# Altium footprint library mypcblib.PcbLib: 124 footprints (part 2 of 8)
Each footprint in its own frame and in the unit in brackets; x right, y up, seen from the top. Pads: shape width x height; smd on the part's side, far side on the other; paste and mask are expansions set on the pad; w line width, h text height; cw(c..) or ccw(c..) is an arc to the next point about the centre after c.
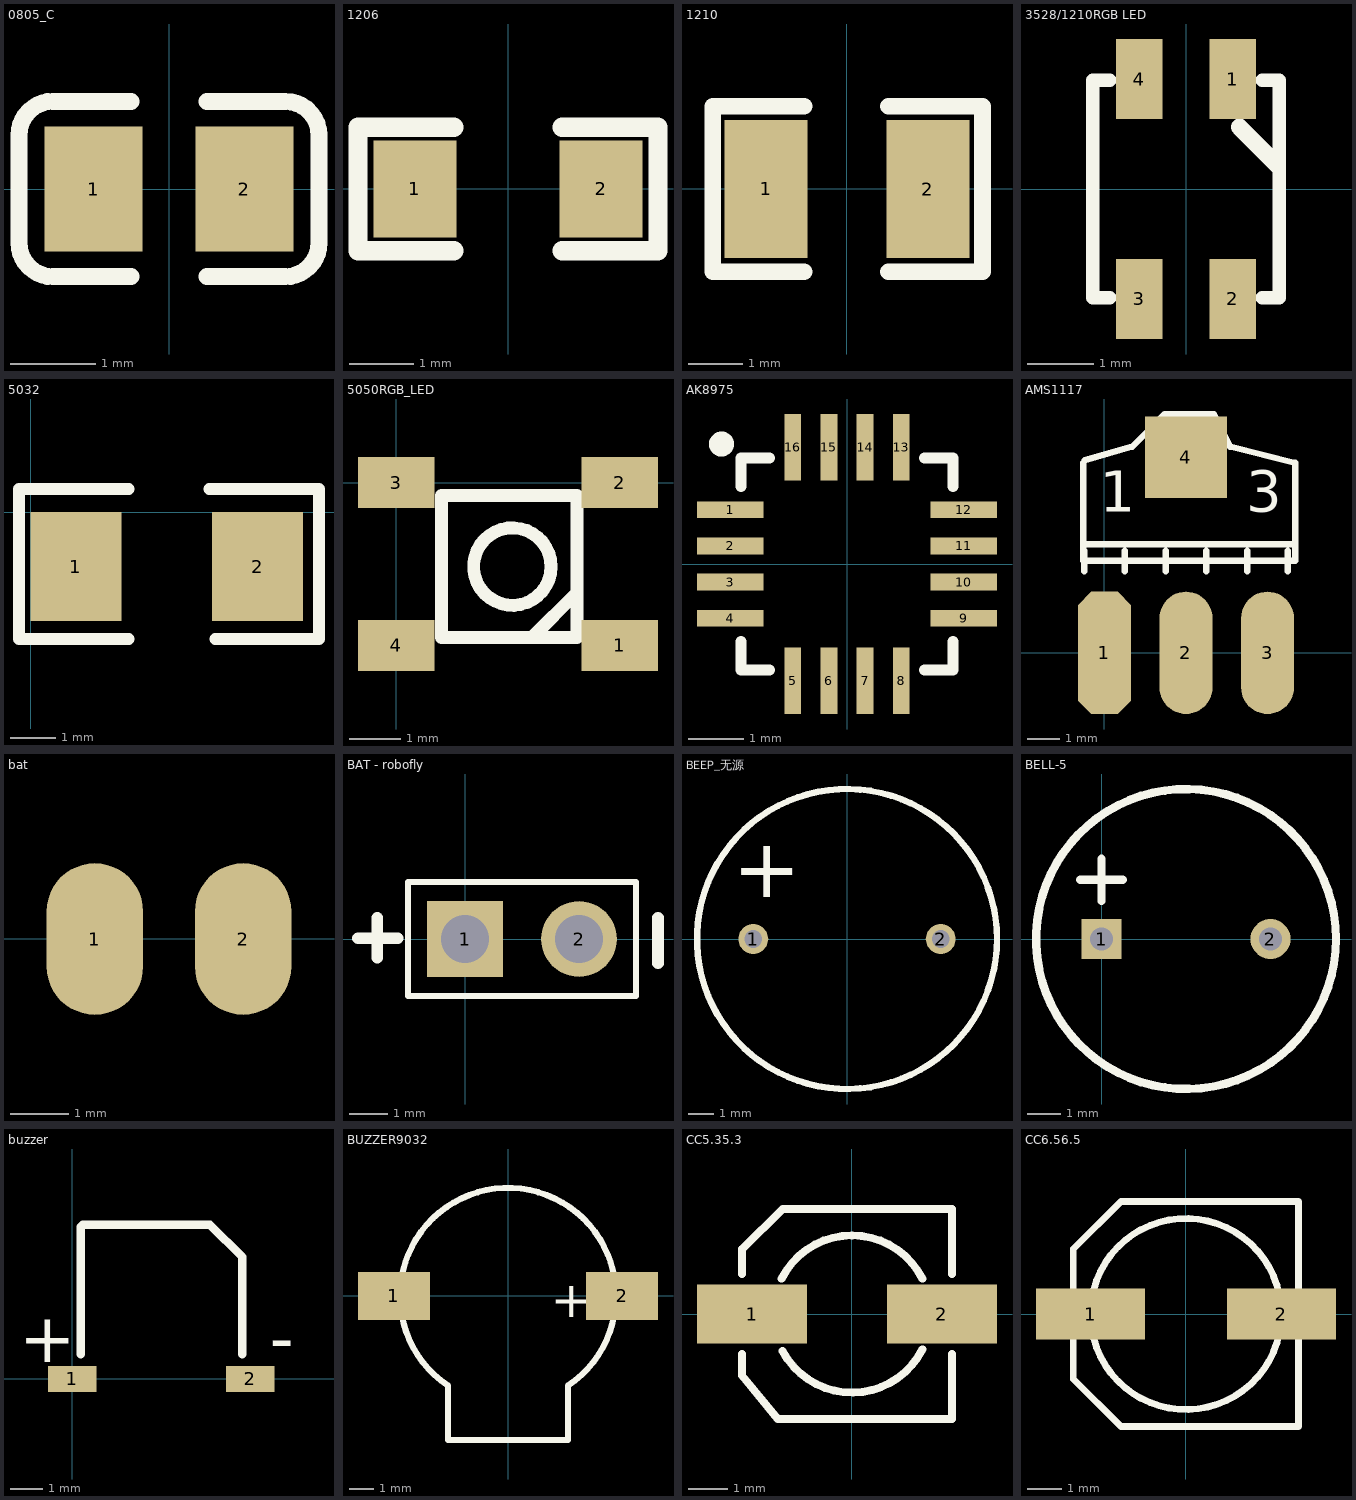
[diagram p1: the footprints below, top view; thin cyan lines are the x and y axes]

## 0805_C [mm]
pads (2):
  rect 1.16x1.47 smd: 1(-0.89,0) 2(0.89,0)
Top Overlay:
  lines w0.2: -0.45,-1.035 -1.37,-1.035 cw(c-1.37,-0.635) -1.77,-0.635 -1.77,0.635 cw(c-1.37,0.635) -1.37,1.035 -0.45,1.035 ; 0.45,-1.035 1.37,-1.035 ccw(c1.37,-0.635) 1.77,-0.635 1.77,0.635 ccw(c1.37,0.635) 1.37,1.035 0.45,1.035
3D body "User Library-0805 SMD Capacitor.STEP": height 0.77, standoff -0.01, extent -0.999,-0.625 1.001,0.625

## 1206 [mil]
pads (2):
  rect 51.18x60 smd: 1(-57.5,0) 2(57.5,0)
Top Overlay:
  lines w12: -33.46,-38 -92.52,-38 -92.52,38 -33.46,38 ; 33.46,-38 92.52,-38 92.52,38 33.46,38

## 1210 [mil]
pads (2):
  rect 60x100 smd: 1(-58.5,0) 2(58.5,0)
Top Overlay:
  lines w12: -31,-60 -97,-60 -97,60 -31,60 ; 30,-60 98,-60 98,60 30,60

## 3528/1210RGB LED [mm]
pads (4):
  rect 0.7x1.2 smd: 1(0.7,1.65) 2(0.7,-1.65) 3(-0.7,-1.65) 4(-0.7,1.65)
Top Overlay:
  lines w0.203: -1.4,-1.63 -1.143,-1.63 ; -1.4,-1.6 -1.4,1.6 ; -1.4,1.63 -1.143,1.63 ; 1.143,-1.63 1.4,-1.63 ; 1.143,1.63 1.4,1.63 ; 1.4,-1.6 1.4,1.6
  lines w0.254: 0.8,0.927 1.371,0.355

## 5032 [mm]
pads (2):
  rect 2x2.4 smd: 1(1,-1.2) 2(5,-1.2)
Top Overlay:
  lines w0.254: 2.159,-2.794 -0.254,-2.794 -0.254,0.508 2.159,0.508 ; 3.937,0.508 6.35,0.508 6.35,-2.794 4.064,-2.794

## 5050RGB_LED [mm]
pads (4):
  rect 1.5x1 smd: 1(4.4,-3.2) 2(4.4,0) 3(0,0) 4(0,-3.2)
Top Overlay:
  circle w0.254: c2.286,-1.651 r0.762
  lines w0.254: 2.667,-3.048 3.556,-2.159 ; 0.889,-3.048 3.556,-3.048 3.556,-0.254 0.889,-0.254 0.889,-3.048

## AK8975 [mm]
pads (16):
  rect 1.2x0.3 smd: 1(-2.1,0.975) 2(-2.1,0.325) 3(-2.1,-0.325) 4(-2.1,-0.975) 9(2.1,-0.975) 10(2.1,-0.325) 11(2.1,0.325) 12(2.1,0.975)
  rect 0.3x1.2 smd: 5(-0.975,-2.1) 6(-0.325,-2.1) 7(0.325,-2.1) 8(0.975,-2.1) 13(0.975,2.1) 14(0.325,2.1) 15(-0.325,2.1) 16(-0.975,2.1)
Top Overlay:
  circle w0.25: c-2.259,2.159 r0.1
  lines w0.2: -1.905,-1.397 -1.905,-1.905 -1.397,-1.905 ; -1.905,1.397 -1.905,1.905 -1.397,1.905 ; 1.397,-1.905 1.905,-1.905 1.905,-1.397 ; 1.397,1.905 1.905,1.905 1.905,1.397

## AMS1117 [mil]
pads (4):
  oct 65x150 smd: 1(0.03,-0.06)
  oval 65x150 smd: 2(100.03,-0.06) 3(200.03,-0.06)
  rect 100x100 smd: 4(100.03,239.94)
Top Overlay:
  lines w7.87: -25.97,232.94 -25.97,132.94 ; -24.97,99.94 -24.97,124.94 ; -24.3,236.27 34.03,252.94 74.03,292.94 134.03,292.94 154.03,252.94 234.03,232.94 234.03,112.94 ; 25.03,99.94 25.03,124.94 ; 75.03,99.94 75.03,124.94 ; 125.03,99.94 125.03,124.94 ; 175.03,99.94 175.03,124.94 ; 225.03,99.94 225.03,124.94 ; -25.97,132.94 -25.97,112.94 234.03,112.94 ; -25.97,132.94 234.03,132.94 234.03,112.94
  text "1" at -5.97,172.94 h50
  text "3" at 174.03,172.94 h50

## bat [mm]
pads (2):
  oval 1.651x2.6 smd: 1(2.541,-0.002) 2(5.081,-0.002)

## BAT - robofly [mm]
pads (2):
  rect 2x2 hole 1.27: 1(0,0)
  round 2 hole 1.27: 2(3,0)
Top Overlay:
  lines w0.152: -1.5,-1.5 4.5,-1.5 4.5,1.5 -1.5,1.5 -1.5,-1.5
  lines w0.305: -2.819,0.023 -1.769,0.023 ; -2.314,-0.492 -2.314,0.559 ; 5.08,-0.641 5.08,0.559

## BEEP_无源 [mm] "无源蜂鸣器，直径12mm，脚距7.5mm"
pads (2):
  round 1.2 hole 0.7: 1(-3.75,0) 2(3.75,0)
Top Overlay:
  circle w0.254: c0,0 r6
  text "+" at -4.572,0.889 h4.06

## BELL-5 [mm]
pads (2):
  rect 1.2x1.2 hole 0.7: 1(0,0)
  round 1.2 hole 0.7: 2(5.08,0)
Top Overlay:
  circle w0.254: c2.54,0 r4.51
  lines w0.254: -0.635,1.778 0.635,1.778 ; 0,1.143 0,2.413

## buzzer [mm]
pads (2):
  rect 1.5x0.8 smd: 1(0,0) 2(5.5,0)
Top Overlay:
  lines w0.254: 0.254,0.762 0.254,4.699 0.317,4.762 4.255,4.762 5.25,3.767 5.25,0.762
  text "+" at -1.651,0.508 h1.52
  text "-" at 6.096,0.508 h1.52

## BUZZER9032 [mm]
pads (2):
  rect 3x2 smd: 1(-4.75,0) 2(4.75,0)
Top Overlay:
  lines w0.254: -2.5,-3.742 -2.5,-6 2.5,-6 ; -2.5,-3.742 cw(c0,0) 2.5,-3.742 2.5,-6.009
  text "+" at 1.778,-0.889 h1.5

## CC5.35.3 [mm]
pads (2):
  rect 2.8x1.5 smd: 1(-2.54,0) 2(2.286,0)
Top Overlay:
  lines w0.2: -2.794,-1.016 -2.794,-1.561 -1.887,-2.667 2.413,-2.667 2.54,-2.667 2.54,-1.016 ; -2.794,1.016 -2.794,1.651 -1.76,2.667 2.54,2.667 2.54,1.016 ; -1.789,0.894 cw(c0,0) 1.789,0.894 ; -1.765,-0.941 ccw(c0,0) 1.789,-0.894

## CC6.56.5 [mm]
pads (2):
  rect 3.2x1.5 smd: 1(-2.794,0) 2(2.8,0)
Top Overlay:
  circle w0.2: c0,0 r2.8
  lines w0.2: -3.302,-1.905 -3.302,1.905 -1.905,3.302 3.302,3.302 3.302,-3.302 -1.905,-3.302 -3.302,-1.905